# Altium footprint library 1.04-电感.PcbLib: 77 footprints (part 2 of 5)
Each footprint in its own frame and in the unit in brackets; x right, y up, seen from the top. Pads: shape width x height; smd on the part's side, far side on the other; paste and mask are expansions set on the pad; w line width, h text height; cw(c..) or ccw(c..) is an arc to the next point about the centre after c.
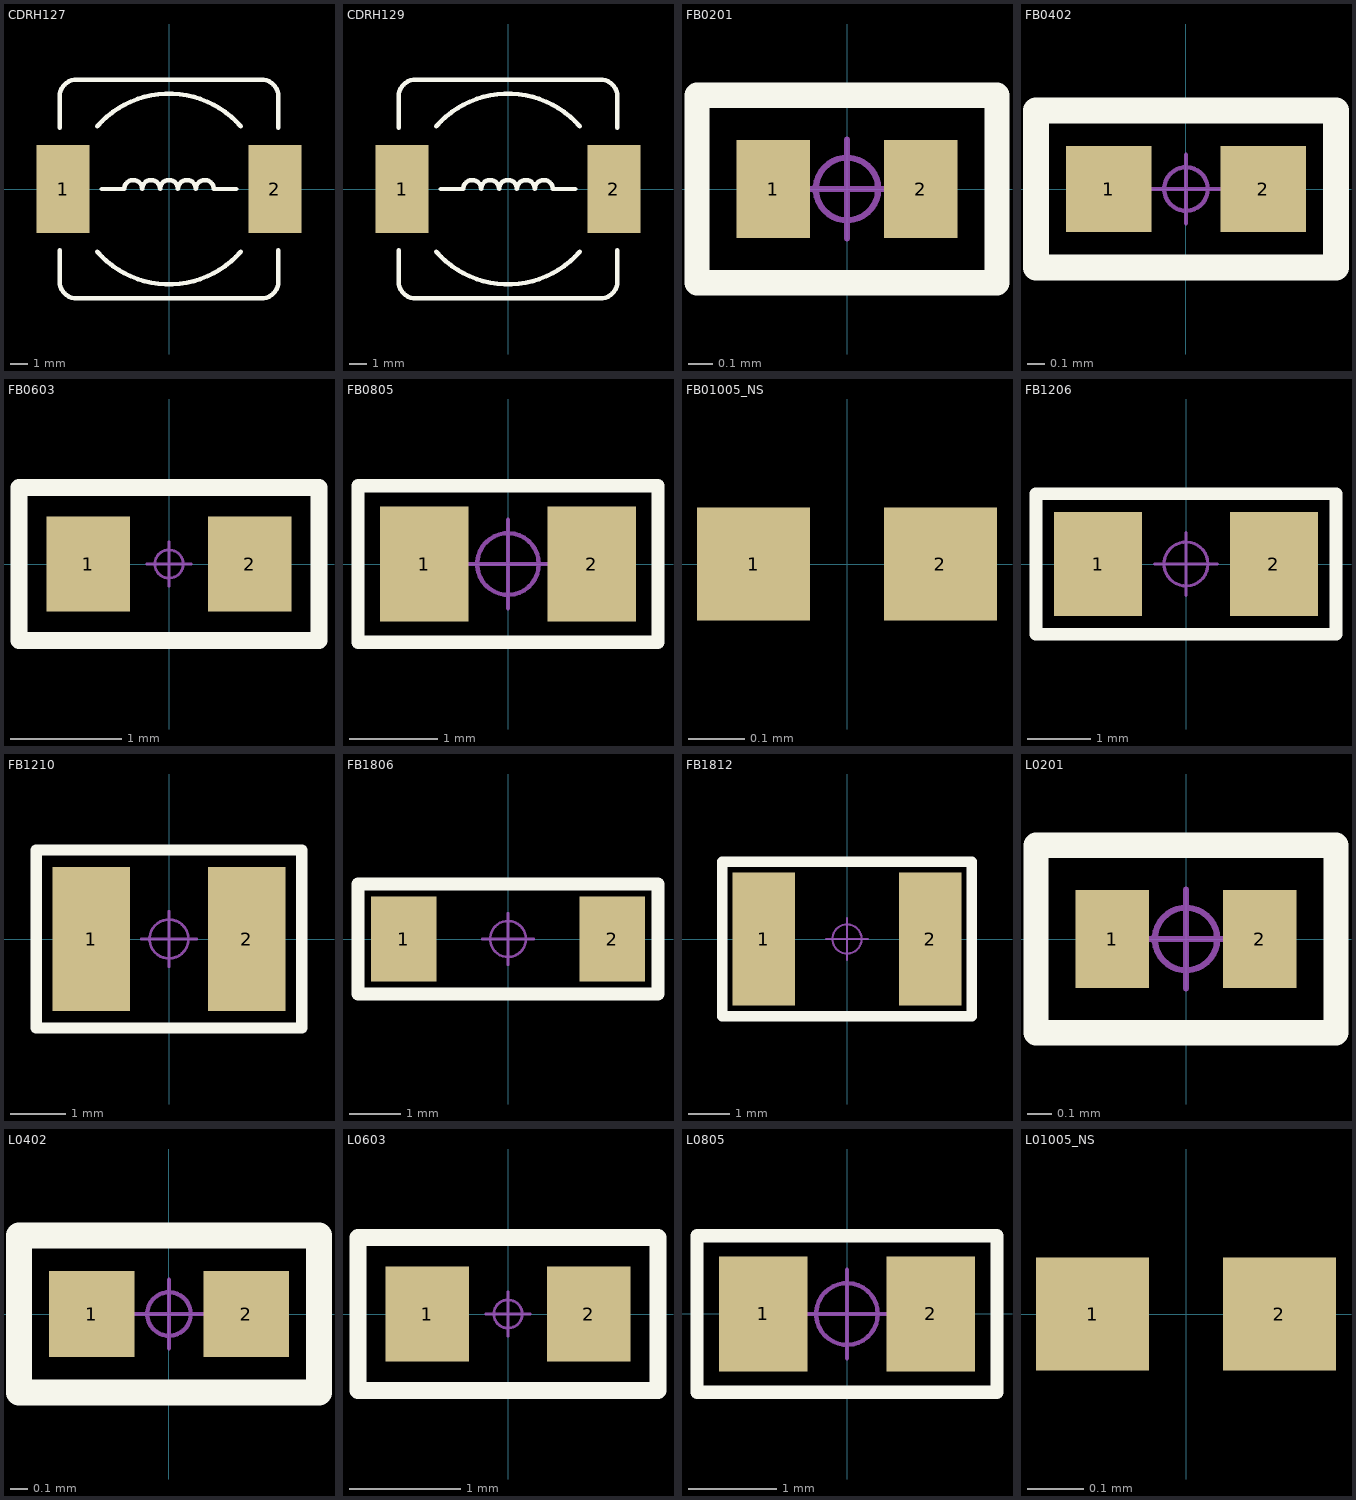
[diagram p1: the footprints below, top view; thin cyan lines are the x and y axes]

## CDRH127 [mm] "12*12*8mm（长宽高）            联系卖家 免费查找封装"
pads (2):
  rect 3x5 smd: 1(-6,0) 2(6,0)
Top Overlay:
  lines w0.254: -6.2,-3.475 -6.2,-5.23 ccw(c-5.23,-5.23) -5.23,-6.2 5.23,-6.2 ccw(c5.23,-5.23) 6.2,-5.23 6.2,-3.475 ; -6.2,3.475 -6.2,5.23 cw(c-5.23,5.23) -5.23,6.2 5.23,6.2 cw(c5.23,5.23) 6.2,5.23 6.2,3.475 ; -4.064,-3.556 ccw(c0,0) 4.064,-3.556 ; -4.064,3.556 cw(c0,0) 4.064,3.556 ; -3.81,0 -2.54,0 cw(c-2.032,0) -1.524,0 cw(c-1.016,0) -0.508,0 cw(c0,0) 0.508,0 cw(c1.016,0) 1.524,0 cw(c2.032,0) 2.54,0 3.81,0
3D body "CDRH127.STEP": height 7.9, standoff 0.1, extent -6,-6 6,6

## CDRH129 [mm] "12*12*9.5mm（长宽高）"
pads (2):
  rect 3x5 smd: 1(-6,0) 2(6,0)
Top Overlay:
  lines w0.254: -6.2,-3.475 -6.2,-5.23 ccw(c-5.23,-5.23) -5.23,-6.2 5.23,-6.2 ccw(c5.23,-5.23) 6.2,-5.23 6.2,-3.475 ; -6.2,3.475 -6.2,5.23 cw(c-5.23,5.23) -5.23,6.2 5.23,6.2 cw(c5.23,5.23) 6.2,5.23 6.2,3.475 ; -4.064,-3.556 ccw(c0,0) 4.064,-3.556 ; -4.064,3.556 cw(c0,0) 4.064,3.556 ; -3.81,0 -2.54,0 cw(c-2.032,0) -1.524,0 cw(c-1.016,0) -0.508,0 cw(c0,0) 0.508,0 cw(c1.016,0) 1.524,0 cw(c2.032,0) 2.54,0 3.81,0
3D body "CDRH127.STEP": height 7.9, standoff 0.1, extent -6,-6 6,6

## FB0201 [mm] "0201贴片磁珠                             联系卖家 免费查找封装"
pads (2):
  rect 0.3x0.4 smd: 1(-0.3,0) 2(0.3,0)
Top Overlay:
  lines w0.102: -0.61,-0.381 -0.61,0.381 0.61,0.381 0.61,-0.381 -0.61,-0.381
Mechanical 15:
  circle w0.025: c0,0 r0.127
  lines w0.025: -0.2,0 0.2,0 ; 0,-0.2 0,0.2
3D body "L0201-2S.stp": height 0.4, standoff 0.1, extent -0.3,-0.15 0.3,0.15

## FB0402 [mm] "0402贴片磁珠"
pads (2):
  rect 0.5x0.5 smd: 1(-0.45,0) 2(0.45,0)
Top Overlay:
  lines w0.152: -0.875,-0.457 -0.875,0.457 0.875,0.457 0.875,-0.457 -0.875,-0.457
Mechanical 15:
  circle w0.025: c0,0 r0.127
  lines w0.025: -0.2,0 0.2,0 ; 0,-0.2 0,0.2
3D body "FB0402-2S.stp": height 0.52, standoff 0, extent -0.51,-0.26 0.51,0.26

## FB0603 [mm] "0603贴片磁珠"
pads (2):
  rect 0.75x0.85 smd: 1(-0.725,0) 2(0.725,0)
Top Overlay:
  lines w0.152: -1.346,-0.686 -1.346,0.686 1.346,0.686 1.346,-0.686 -1.346,-0.686
Mechanical 15:
  circle w0.025: c0,0 r0.127
  lines w0.025: -0.2,0 0.2,0 ; 0,-0.2 0,0.2
3D body "L0603H08-2S.stp": height 0.8, standoff 0, extent -0.8,-0.4 0.8,0.4

## FB0805 [mm] "0805贴片磁珠"
height 0.5
pads (2):
  rect 1x1.3 smd: 1(-0.95,0) 2(0.95,0)
Top Overlay:
  lines w0.152: -1.702,-0.889 1.702,-0.889 1.702,0.889 -1.702,0.889 -1.702,-0.889
Mechanical 15:
  circle w0.05: c0,0 r0.35
  lines w0.05: -0.5,0 0.5,0 ; 0,-0.5 0,0.5
3D body "L0805H13-2S.stp": height 1.3, standoff 0, extent -1,-0.65 1,0.65

## FB01005_NS [mm] "01005贴片磁珠                            联系卖家 免费查找封装"
pads (2):
  rect 0.2x0.2 smd paste+0 mask+0: 1(-0.165,0) 2(0.165,0)
3D body "FB01005-2S.stp": height 0.2, standoff 0, extent -0.2,-0.1 0.199,0.1

## FB1206 [mm] "1206贴片磁珠"
pads (2):
  rect 1.4x1.65 smd: 1(-1.4,0) 2(1.4,0)
Top Overlay:
  lines w0.203: -2.388,-1.118 2.388,-1.118 2.388,1.118 -2.388,1.118 -2.388,-1.118
Mechanical 15:
  circle w0.05: c0,0 r0.35
  lines w0.05: -0.5,0 0.5,0 ; 0,-0.5 0,0.5
3D body "L1206-2S.stp": height 1.1, standoff 0, extent -1.6,-0.798 1.6,0.798

## FB1210 [mm] "1210贴片磁珠"
pads (2):
  rect 1.4x2.6 smd: 1(-1.4,0) 2(1.4,0)
Top Overlay:
  lines w0.203: -2.388,-1.6 2.388,-1.6 2.388,1.6 -2.388,1.6 -2.388,-1.6
Mechanical 15:
  circle w0.05: c0,0 r0.35
  lines w0.05: -0.5,0 0.5,0 ; 0,-0.5 0,0.5
3D body "L1210-2S.stp": height 0.92, standoff 0.02, extent -1.6,-1.26 1.6,1.26

## FB1806 [mil] "1806贴片磁珠"
pads (2):
  rect 50x65 smd: 1(-80.01,-0.01) 2(80,0)
Top Overlay:
  lines w10: -115,42 -115,-42 65,-42 115,-42 115,42 65,42 -115,42 ; -115,42 -115,42
Mechanical 15:
  circle w1.97: c0,0 r13.78
  lines w1.97: -19.68,0 19.68,0 ; 0,-19.68 0,19.68
3D body "L1806H16-2S.stp": height 62.99, standoff -0.08, extent -88.58,-31.49 88.58,31.5

## FB1812 [mm] "1812贴片磁珠"
pads (2):
  rect 1.5x3.2 smd: 1(-2,0) 2(2,0)
Top Overlay:
  lines w0.254: 1.143,-1.854 2.997,-1.854 2.997,1.854 1.27,1.854 ; 1.524,1.854 -2.997,1.854 -2.997,-1.854 1.753,-1.854
Mechanical 15:
  circle w0.05: c0,0 r0.35
  lines w0.05: -0.5,0 0.5,0 ; 0,-0.5 0,0.5
3D body "L1812H26-2S.stp": height 2.6, standoff 0, extent -2.25,-1.6 2.25,1.6

## L0201 [mm] "0201贴片叠层电感"
pads (2):
  rect 0.3x0.4 smd: 1(-0.3,0) 2(0.3,0)
Top Overlay:
  lines w0.102: -0.61,-0.381 -0.61,0.381 0.61,0.381 0.61,-0.381 -0.61,-0.381
Mechanical 15:
  circle w0.025: c0,0 r0.127
  lines w0.025: -0.2,0 0.2,0 ; 0,-0.2 0,0.2
3D body "L0201-B-2.stp": height 0.3, standoff 0, extent -0.3,-0.15 0.3,0.15

## L0402 [mm] "0402贴片叠层电感"
pads (2):
  rect 0.5x0.5 smd: 1(-0.45,0) 2(0.45,0)
Top Overlay:
  lines w0.152: -0.875,-0.457 0.875,-0.457 0.875,0.457 -0.875,0.457 -0.875,-0.457
Mechanical 15:
  circle w0.025: c0,0 r0.127
  lines w0.025: -0.2,0 0.2,0 ; 0,-0.2 0,0.2
3D body "L0402-A2-2.stp": height 0.52, standoff 0, extent -0.51,-0.26 0.51,0.26

## L0603 [mm] "0603贴片叠层电感"
pads (2):
  rect 0.75x0.85 smd: 1(-0.725,0) 2(0.725,0)
Top Overlay:
  lines w0.152: -1.346,-0.686 -1.346,0.686 1.346,0.686 1.346,-0.686 -1.346,-0.686
Mechanical 15:
  circle w0.025: c0,0 r0.127
  lines w0.025: -0.2,0 0.2,0 ; 0,-0.2 0,0.2
3D body "L0603H08-2S.stp": height 0.8, standoff 0, extent -0.8,-0.4 0.8,0.4

## L0805 [mm] "0805贴片叠层电感"
height 0.5
pads (2):
  rect 1x1.3 smd: 1(-0.95,0) 2(0.95,0)
Top Overlay:
  lines w0.152: -1.702,-0.889 -1.702,0.889 1.702,0.889 1.702,-0.889 -1.702,-0.889
Mechanical 15:
  circle w0.05: c0,0 r0.35
  lines w0.05: -0.5,0 0.5,0 ; 0,-0.5 0,0.5
3D body "L0805H13-2S.stp": height 1.3, standoff 0, extent -1,-0.65 1,0.65

## L01005_NS [mm] "01005贴片叠层电感                   联系卖家 免费查找封装"
pads (2):
  rect 0.2x0.2 smd paste+0 mask+0: 1(-0.165,0) 2(0.165,0)
3D body "L01005H20-2.stp": height 0.2, standoff 0, extent -0.199,-0.1 0.199,0.1